# Altium footprint library ExtendBoard.PcbLib: 105 footprints (part 7 of 7)
Each footprint in its own frame and in the unit in brackets; x right, y up, seen from the top. Pads: shape width x height; smd on the part's side, far side on the other; paste and mask are expansions set on the pad; w line width, h text height; cw(c..) or ccw(c..) is an arc to the next point about the centre after c.
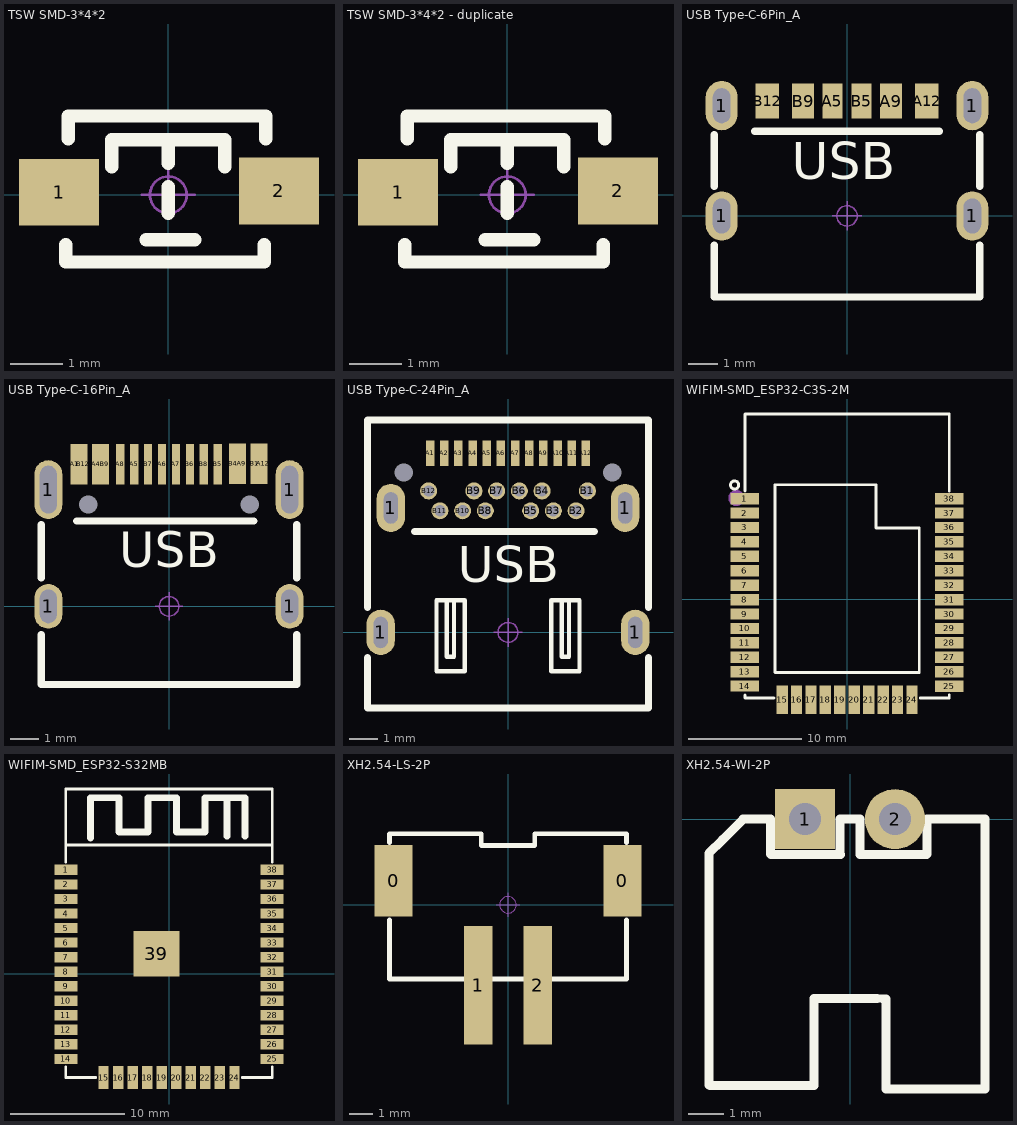
[diagram p6: the footprints below, top view; thin cyan lines are the x and y axes]

## TSW SMD-3*4*2 [mm] "3*4*2mm"
pads (2):
  rect 1.524x1.27 smd: 1(-2.075,0.05) 2(2.1,0.075)
Top Overlay:
  lines w0.254: -1.95,-0.95 -1.95,-1.275 1.825,-1.275 1.825,-0.95 ; -1.9,1.067 -1.9,1.5 1.85,1.5 1.85,1.067 ; -1.075,0.533 -1.075,1.05 1.075,1.05 1.075,0.533 ; -0.425,-0.85 0.5,-0.85 ; 0,-0.35 0,0.152 ; 0,0.6 0,1
Mechanical 15:
  circle w0.05: c0,0 r0.35
  lines w0.05: -0.5,0 0.5,0 ; 0,-0.35 0,0.5

## TSW SMD-3*4*2 - duplicate [mm] "3*4*2mm"
pads (2):
  rect 1.524x1.27 smd: 1(-2.075,0.05) 2(2.1,0.075)
Top Overlay:
  lines w0.254: -1.95,-0.95 -1.95,-1.275 1.825,-1.275 1.825,-0.95 ; -1.9,1.067 -1.9,1.5 1.85,1.5 1.85,1.067 ; -1.075,0.533 -1.075,1.05 1.075,1.05 1.075,0.533 ; -0.425,-0.85 0.5,-0.85 ; 0,-0.35 0,0.152 ; 0,0.6 0,1
Mechanical 15:
  circle w0.05: c0,0 r0.35
  lines w0.05: -0.5,0 0.5,0 ; 0,-0.35 0,0.5

## USB Type-C-6Pin_A [mm]
pads (10):
  oval 1.1x1.7 hole 0.6 slot 1.2 at 90 deg: 1(-4.32,0) 1(-4.32,3.8) 1(4.32,0) 1(4.32,3.8)
  rect 0.7x1.2 smd: A5(-0.5,3.96) B5(0.5,3.96)
  rect 0.76x1.2 smd: A9(1.51,3.96) B9(-1.51,3.96)
  rect 0.8x1.2 smd: A12(2.75,3.96) B12(-2.75,3.96)
Top Overlay:
  lines w0.254: -4.572,-1.016 -4.572,-2.794 4.572,-2.794 4.572,-1.016 ; -4.572,1.016 -4.572,2.794 ; -3.175,2.921 3.175,2.921 ; 4.572,1.016 4.572,2.794
  text "USB" at -1.905,1.27 h1.27
Mechanical 15:
  circle w0.05: c0,0 r0.35
  lines w0.05: -0.5,0 0.5,0 ; 0,-0.5 0,0.5
3D body "USB Type-C_B.STEP": height 3.22, standoff -0.94, extent -4.47,-2.6 4.47,4.2

## USB Type-C-16Pin_A [mm]
pads (22):
  round 0 hole 0.65: 0(-2.89,3.65) 0(2.89,3.65)
  oval 1x1.6 hole 0.6 slot 1.2 at 90 deg: 1(-4.32,0) 1(4.32,0)
  oval 1x2.1 hole 0.6 slot 1.7 at 90 deg: 1(-4.32,4.18) 1(4.32,4.18)
  rect 0.3x1.45 smd: A1(-3.375,5.092) A4(-2.6,5.092) A5(-1.25,5.092) A6(-0.25,5.092) A7(0.25,5.092) A8(-1.75,5.092) A9(2.6,5.1) A12(3.375,5.1) B1(3.075,5.1) B4(2.3,5.1) B5(1.75,5.092) B6(0.75,5.092) B7(-0.75,5.092) B8(1.25,5.092) B9(-2.3,5.092) B12(-3.075,5.092)
Top Overlay:
  lines w0.254: -4.572,-1.016 -4.572,-2.794 4.572,-2.794 4.572,-1.016 ; -4.572,1.016 -4.572,2.921 ; -3.302,3.048 3.048,3.048 ; 4.572,1.016 4.572,2.921
  text "USB" at -1.778,1.397 h1.27
Mechanical 15:
  circle w0.05: c0,0 r0.35
  lines w0.05: -0.5,0 0.5,0 ; 0,-0.5 0,0.5
3D body "USB Type-C_A.STEP": height 3.25, standoff -0.85, extent -4.47,-2.6 4.47,5.3

## USB Type-C-24Pin_A [mm]
pads (30):
  round 0 hole 0.65: 0(-3.675,5.64) 0(3.675,5.64)
  oval 1x1.6 hole 0.5 slot 1.1 at 90 deg: 1(-4.49,0) 1(4.49,0)
  oval 1x1.7 hole 0.5 slot 1.1 at 90 deg: 1(-4.13,4.39) 1(4.13,4.39)
  rect 0.3x0.9 smd: A1(-2.75,6.315) A2(-2.25,6.315) A3(-1.75,6.315) A4(-1.25,6.315) A5(-0.75,6.315) A6(-0.25,6.315) A7(0.25,6.315) A8(0.75,6.315) A9(1.25,6.315) A10(1.75,6.315) A11(2.25,6.315) A12(2.75,6.315)
  round 0.6 hole 0.4: B1(2.8,4.99) B2(2.4,4.29) B3(1.6,4.29) B4(1.2,4.99) B5(0.8,4.29) B6(0.4,4.99) B7(-0.4,4.99) B8(-0.8,4.29) B9(-1.2,4.99) B10(-1.6,4.29) B11(-2.4,4.29) B12(-2.8,4.99)
Top Overlay:
  lines w0.152: -2.159,1.13 -2.159,-0.855 -1.956,-0.855 -1.905,-0.855 -1.905,1.13 ; 1.898,1.13 1.898,-0.855 2.152,-0.855 2.152,1.13 ; -2.52,-1.37 -2.52,1.13 -1.52,1.13 -1.52,-1.37 -2.52,-1.37 ; 1.524,-1.37 2.524,-1.37 2.524,1.13 1.524,1.13 1.524,-1.37
  lines w0.254: -4.953,-0.889 -4.953,-2.667 4.953,-2.667 4.953,-0.889 ; -4.953,0.889 -4.953,7.493 4.953,7.493 4.953,0.889 ; -3.302,3.556 3.048,3.556
  text "USB" at -1.778,1.778 h1.27
Mechanical 15:
  circle w0.05: c0,0 r0.35
  lines w0.05: -0.5,0 0.5,0 ; 0,-0.5 0,0.5
3D body "USB Type-C_24pin_A.STEP": height 3.31, standoff -1.33, extent -4.85,-2.53 4.85,7.37

## WIFIM-SMD_ESP32-C3S-2M [mm]
pads (38):
  rect 2.5x1 smd: 1(-9,8.855) 2(-9,7.585) 3(-9,6.315) 4(-9,5.045) 5(-9,3.775) 6(-9,2.505) 7(-9,1.235) 8(-9,-0.035) 9(-9,-1.305) 10(-9,-2.575) 11(-9,-3.845) 12(-9,-5.115) 13(-9,-6.385) 14(-9,-7.645) 25(9,-7.655) 26(9,-6.385) 27(9,-5.115) 28(9,-3.845) 29(9,-2.575) 30(9,-1.305) 31(9,-0.035) 32(9,1.235) 33(9,2.505) 34(9,3.775) 35(9,5.045) 36(9,6.315) 37(9,7.585) 38(9,8.855)
  rect 1x2.5 smd: 15(-5.715,-8.855) 16(-4.445,-8.855) 17(-3.175,-8.855) 18(-1.905,-8.855) 19(-0.635,-8.855) 20(0.635,-8.855) 21(1.905,-8.855) 22(3.175,-8.855) 23(4.445,-8.855) 24(5.715,-8.839)
Top Overlay:
  circle w0.254: c-9.9,10.055 r0.361
  lines w0.254: -9,-8.437 -9,-8.695 -6.446,-8.695 ; -9,9.536 -9,16.305 9,16.305 9,9.536 ; 6.446,-8.695 9,-8.695 9,-8.437 ; -6.35,-6.435 6.35,-6.435 6.35,6.265 2.54,6.265 2.54,10.075 -6.35,10.075 -6.35,-6.435
Mechanical 15:
  circle w0.7: c-9.754,8.909 r0.35
3D body "User Library-esp-wroom-32.STEP": height 3, standoff -0.04, extent -9.07,-8.995 9,16.545

## WIFIM-SMD_ESP32-S32MB [mm]
pads (39):
  rect 2x0.9 smd: 1(-9,9.068) 2(-9,7.798) 3(-9,6.528) 4(-9,5.258) 5(-9,3.988) 6(-9,2.718) 7(-9,1.448) 8(-9,0.178) 9(-9,-1.092) 10(-9,-2.362) 11(-9,-3.632) 12(-9,-4.902) 13(-9,-6.172) 14(-9,-7.442) 25(9,-7.442) 26(9,-6.172) 27(9,-4.902) 28(9,-3.632) 29(9,-2.362) 30(9,-1.092) 31(9,0.178) 32(9,1.448) 33(9,2.718) 34(9,3.988) 35(9,5.258) 36(9,6.528) 37(9,7.798) 38(9,9.068)
  rect 0.9x2 smd: 15(-5.715,-9.068) 16(-4.445,-9.068) 17(-3.175,-9.068) 18(-1.905,-9.068) 19(-0.635,-9.068) 20(0.635,-9.068) 21(1.905,-9.068) 22(3.175,-9.068) 23(4.445,-9.068) 24(5.715,-9.068)
  rect 4x4 smd: 39(-1.1,1.752)
Top Overlay:
  lines w0.254: -9.017,-8.123 -9.017,-9.068 -6.396,-9.068 ; -9.017,9.749 -9.017,16.132 9.017,16.132 9.017,9.749 ; -9.017,11.232 9.017,11.232 ; 6.396,-9.068 9.017,-9.068 9.017,-8.123
  lines w0.6: -6.85,11.868 -6.85,15.368 -4.35,15.368 ; -4.351,15.367 -4.351,12.367 -1.849,12.367 -1.849,15.367 0.65,15.367 0.65,12.367 3.149,12.367 3.149,15.367 6.65,15.367 6.65,12 ; 5.08,12 5.08,15.367
3D body "User Library-esp-wroom-32.STEP": height 3, standoff -0.04, extent -9.07,-9.214 9,16.326

## XH2.54-LS-2P [mm] "长：10mm，宽：6mm，高：8.3mm"
pads (4):
  rect 1.6x3 smd: 0(-4.826,1.016) 0(4.826,1.016)
  rect 1.2x5 smd: 1(-1.25,-3.383) 2(1.25,-3.383)
Top Overlay:
  lines w0.2: -5,-0.625 -5,-3.125 5,-3.125 5,-0.625 ; 5,2.625 5,3 1.125,3 1.125,2.5 -1.125,2.5 -1.125,3 -5,3 -5,2.625 ; -5,2.625 -5,2.625
Mechanical 15:
  circle w0.05: c0,0 r0.35
  lines w0.05: -0.5,0 0.5,0 ; 0,-0.5 0,0.5
3D body "XH2.54-LS-2P.STEP": height 8, standoff 0, extent -5,-6 5,3

## XH2.54-WI-2P [mm] "接插件，2P"
pads (2):
  rect 1.7x1.7 hole 0.9: 1(-1.27,0)
  round 1.7 hole 0.9: 2(1.27,0)
Top Overlay:
  lines w0.254: 2.164,0 2.164,-0.988 2.15,-1.002 0.284,-1.002 0.284,0 -0.288,0 -0.288,-0.982 -0.274,-0.996 -2.23,-0.996 -2.244,-0.982 -2.244,0 -3.02,0 -3.602,-0.582 -3.986,-0.966 -3.986,-7.502 -3.96,-7.528 -1.016,-7.528 -1.016,-5.058 0.762,-5.058 1.016,-5.08 1.016,-7.62 1.27,-7.62 3.81,-7.62 3.81,0 2.774,0 2.176,0
3D body "XH2.54-2P_H.STEP": height 5.73, standoff -3.37, extent -3.77,-7.35 3.77,0.35